# Altium schematic symbol library IC_ADI.SCHLIB: 3169 symbols (part 50 of 181)
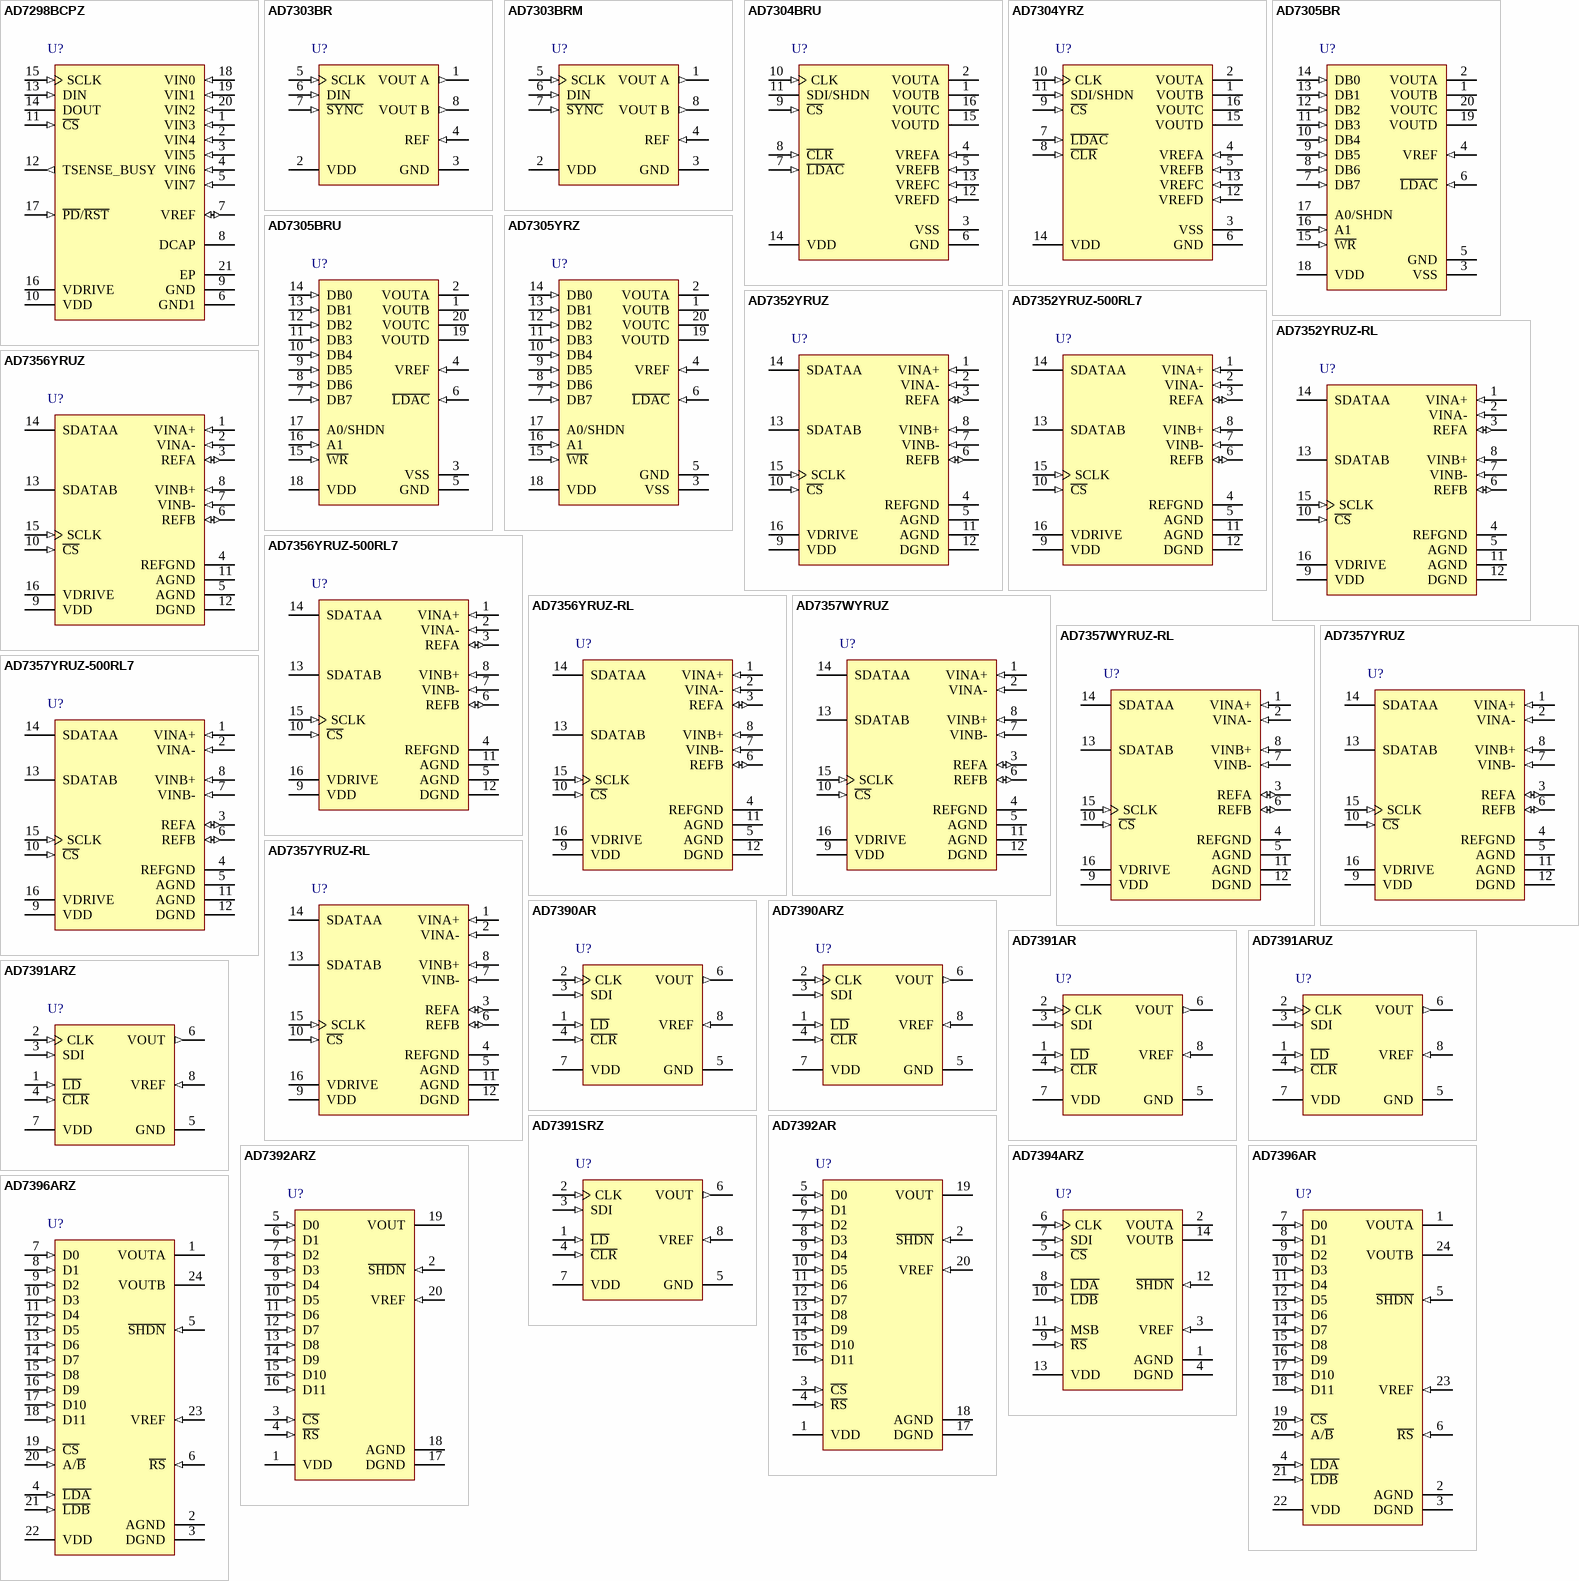
[diagram p240: symbols AD7298BCPZ to AD7396ARZ]

## AD7357YRUZ-500RL7
designator U?
Dual 14-Bit SAR Analog-to-Digital Converter with Serial, SPI Interface, Simultaneous Sampling, 4.25MSPS, -40 to +125 degC, RU-16, Pb-Free, Reel; Generic Part Number: AD7357; PartNumber: AD7357YRUZ-500RL7; Resolution (Bits): 14; Channels: 2; Throughput Rate (SPS): 4.25M; Interface: Ser, SPI; Automotive Qualified: Yes; DatasheetVersion: Rev.B; PackageVersion: Nov-2002; PackageReference: RU-16; PackageDescription: 16-Lead Thin Shrink Small Outline Package [TSSOP]; Supplier Part Number 1: AD7357YRUZ-500RL7-ND; Supplier Part Number 2: 584-AD7357YRUZ-500R7; RoHS: Y; Packing: Reel; Mounting Technology: Surface Mount; Code_JEDEC: MO-153-AB; ComponentLink1Description: Manufacturer URL; ComponentLink2Description: Datasheet; ComponentLink3Description: Package Specification; ComponentLink4Description: Product URL
footprint TSSOP16_0.65 (Footprint not found)
pins: 1 VINA+ (in) "Analog Inputs of ADC A. These analog inputs form a fully differential pair.", 2 VINA- (in) "Analog Inputs of ADC A. These analog inputs form a fully differential pair.", 3 REFA (io) "Reference Decoupling Capacitor Pins. Decoupling capacitors are connected between these pins and the REFGND pin to decouple the reference buffer for each respective ADC. It is recommended to decouple each reference pin with a (See Datasheet)", 4 REFGND (power) "Reference Ground. This is the ground reference point for the reference circuitry on the AD7357. Any external reference signal should be referred to this REFGND voltage. Decoupling capacitors must be placed between this pin (See Datasheet)", 5 AGND (power) "Analog Ground. This is the ground reference point for all analog circuitry on the AD7357. All analog input signals should be referred to this AGND voltage. The AGND and DGND voltages should ideally be at the same potential (See Datasheet)", 6 REFB (io) "Reference Decoupling Capacitor Pins. Decoupling capacitors are connected between these pins and the REFGND pin to decouple the reference buffer for each respective ADC. It is recommended to decouple each reference pin with a (See Datasheet)", 7 VINB- (in) "Analog Inputs of ADC B. These analog inputs form a fully differential pair.", 8 VINB+ (in) "Analog Inputs of ADC B. These analog inputs form a fully differential pair.", 9 VDD (power) "Power Supply Input. The VDD range for the AD7357 is 2.5 V +/- 10%. The supply should be decoupled to AGND with a 0.1uF capacitor and a 10uF tantalum capacitor.", 10 ~{CS} (in) "Chip Select. Active low, logic input. This input provides the dual function of initiating conversions on the AD7357 and framing the serial data transfer.", 11 AGND (power) "Analog Ground. This is the ground reference point for all analog circuitry on the AD7357. All analog input signals should be referred to this AGND voltage. The AGND and DGND voltages should ideally be at the same potential (See Datasheet)", 12 DGND (power) "Digital Ground. This is the ground reference point for all digital circuitry on the AD7357. This pin should connect to the DGND plane of a system. The DGND and AGND voltages should ideally be at the same potential and must (See Datasheet)", 13 SDATAB (hiz) "Serial Data Outputs. The data output is supplied to each pin as a serial data stream. The bits are clocked out on the falling edge of the SCLK input. 16 SCLK falling edges are required to access the 14 bits of data from the (See Datasheet)", 14 SDATAA (hiz) "Serial Data Outputs. The data output is supplied to each pin as a serial data stream. The bits are clocked out on the falling edge of the SCLK input. 16 SCLK falling edges are required to access the 14 bits of data from the (See Datasheet)", 15 SCLK (in) "Serial Clock. Logic input. A serial clock input provides the SCLK for accessing the data from the AD7357. This clock is also used as the clock source for the conversion process.", 16 VDRIVE (power) "Logic Power Supply Input. The voltage supplied at this pin determines at what voltage the interface operates. This pin should be decoupled to DGND. The voltage at this pin may be different to that at VDD."

## AD7357YRUZ-RL
designator U?
Dual 14-Bit SAR Analog-to-Digital Converter with Serial, SPI Interface, Simultaneous Sampling, 4.25MSPS, -40 to +125 degC, RU-16, Pb-Free, Reel; Generic Part Number: AD7357; PartNumber: AD7357YRUZ-RL; Resolution (Bits): 14; Channels: 2; Throughput Rate (SPS): 4.25M; Interface: Ser, SPI; Automotive Qualified: Yes; DatasheetVersion: Rev.B; PackageVersion: Nov-2002; PackageReference: RU-16; PackageDescription: 16-Lead Thin Shrink Small Outline Package [TSSOP]; Supplier Part Number 1: AD7357YRUZ-RL-ND; Supplier Part Number 2: 584-AD7357YRUZ-R; RoHS: Y; Packing: Reel; Mounting Technology: Surface Mount; Code_JEDEC: MO-153-AB; ComponentLink1Description: Manufacturer URL; ComponentLink2Description: Datasheet; ComponentLink3Description: Package Specification; ComponentLink4Description: Product URL
footprint TSSOP16_0.65 (Footprint not found)
pins: 1 VINA+ (in) "Analog Inputs of ADC A. These analog inputs form a fully differential pair.", 2 VINA- (in) "Analog Inputs of ADC A. These analog inputs form a fully differential pair.", 3 REFA (io) "Reference Decoupling Capacitor Pins. Decoupling capacitors are connected between these pins and the REFGND pin to decouple the reference buffer for each respective ADC. It is recommended to decouple each reference pin with a (See Datasheet)", 4 REFGND (power) "Reference Ground. This is the ground reference point for the reference circuitry on the AD7357. Any external reference signal should be referred to this REFGND voltage. Decoupling capacitors must be placed between this pin (See Datasheet)", 5 AGND (power) "Analog Ground. This is the ground reference point for all analog circuitry on the AD7357. All analog input signals should be referred to this AGND voltage. The AGND and DGND voltages should ideally be at the same potential (See Datasheet)", 6 REFB (io) "Reference Decoupling Capacitor Pins. Decoupling capacitors are connected between these pins and the REFGND pin to decouple the reference buffer for each respective ADC. It is recommended to decouple each reference pin with a (See Datasheet)", 7 VINB- (in) "Analog Inputs of ADC B. These analog inputs form a fully differential pair.", 8 VINB+ (in) "Analog Inputs of ADC B. These analog inputs form a fully differential pair.", 9 VDD (power) "Power Supply Input. The VDD range for the AD7357 is 2.5 V +/- 10%. The supply should be decoupled to AGND with a 0.1uF capacitor and a 10uF tantalum capacitor.", 10 ~{CS} (in) "Chip Select. Active low, logic input. This input provides the dual function of initiating conversions on the AD7357 and framing the serial data transfer.", 11 AGND (power) "Analog Ground. This is the ground reference point for all analog circuitry on the AD7357. All analog input signals should be referred to this AGND voltage. The AGND and DGND voltages should ideally be at the same potential (See Datasheet)", 12 DGND (power) "Digital Ground. This is the ground reference point for all digital circuitry on the AD7357. This pin should connect to the DGND plane of a system. The DGND and AGND voltages should ideally be at the same potential and must (See Datasheet)", 13 SDATAB (hiz) "Serial Data Outputs. The data output is supplied to each pin as a serial data stream. The bits are clocked out on the falling edge of the SCLK input. 16 SCLK falling edges are required to access the 14 bits of data from the (See Datasheet)", 14 SDATAA (hiz) "Serial Data Outputs. The data output is supplied to each pin as a serial data stream. The bits are clocked out on the falling edge of the SCLK input. 16 SCLK falling edges are required to access the 14 bits of data from the (See Datasheet)", 15 SCLK (in) "Serial Clock. Logic input. A serial clock input provides the SCLK for accessing the data from the AD7357. This clock is also used as the clock source for the conversion process.", 16 VDRIVE (power) "Logic Power Supply Input. The voltage supplied at this pin determines at what voltage the interface operates. This pin should be decoupled to DGND. The voltage at this pin may be different to that at VDD."

## AD7390AR
designator U?
Single 12-Bit Digital-to-Analog Converter with Serial Interface, -40 to 85 degC, R-8, Tube; Generic Part Number: AD7390; PartNumber: AD7390AR; # DAC Outputs: 1; Max V+: 5.5V; Op Pwr Diss: 500礧; Resolution (Bits): 12; Settling Time: 60祍; Single Supply: Yes; DatasheetVersion: Rev.A; PackageVersion: 060506-A; PackageReference: R-8; PackageDescription: 8-Lead Standard Small Outline Package [SOIC_N] Narrow Body; Supplier Part Number 1: AD7390AR-ND; Supplier Part Number 2: 584-AD7390AR; Packing: Tube; RoHS: N; Mounting Technology: Surface Mount; Code_JEDEC: MS-012-AA; Code_IPC: SOIC127P600-8; ComponentLink1Description: Manufacturer URL; ComponentLink2Description: Datasheet; ComponentLink3Description: Package Specification; ComponentLink4Description: Product URL
footprint SOIC8_1.27 (Footprint not found)
pins: 1 ~{LD} (in) "Load Strobe. Transfers shift registerdata to DAC register while active low.See truth table for operation.", 2 CLK (in) "Clock Input. Positive edge clocks data into shift register.", 3 SDI (in) "Serial Data Input. Data loads directly into the shift register.", 4 ~{CLR} (in) "Resets DAC register to zero condition.Active low input.", 5 GND (power) "Analog and Digital Ground.", 6 VOUT (out) "DAC Voltage Output. Full-scale output 1 LSB less than reference input voltage REF.", 7 VDD (power) "Positive Power Supply Input. Specified range of operation 2.7 V to 5.5 V.", 8 VREF (in) "DAC Reference Input Pin. Establishes DAC full-scale voltage."

## AD7390ARZ
designator U?
Single 12-Bit Digital-to-Analog Converter with Serial Interface, -40 to 85 degC, R-8, Pb-Free, Tube; Generic Part Number: AD7390; PartNumber: AD7390ARZ; # DAC Outputs: 1; Max V+: 5.5V; Op Pwr Diss: 500礧; Resolution (Bits): 12; Settling Time: 60祍; Single Supply: Yes; DatasheetVersion: Rev.A; PackageVersion: 060506-A; PackageReference: R-8; PackageDescription: 8-Lead Standard Small Outline Package [SOIC_N] Narrow Body; Supplier Part Number 1: AD7390ARZ-ND; Supplier Part Number 2: 1498718; Supplier Part Number 3: 15P0796; Supplier Part Number 4: 59K4759; Supplier Part Number 5: 584-AD7390ARZ; Packing: Tube; RoHS: Y; Mounting Technology: Surface Mount; Code_JEDEC: MS-012-AA; Code_IPC: SOIC127P600-8; ComponentLink1Description: Manufacturer URL; ComponentLink2Description: Datasheet; ComponentLink3Description: Package Specification; ComponentLink4Description: Product URL
footprint SOIC8_1.27 (Footprint not found)
pins: 1 ~{LD} (in) "Load Strobe. Transfers shift registerdata to DAC register while active low.See truth table for operation.", 2 CLK (in) "Clock Input. Positive edge clocks data into shift register.", 3 SDI (in) "Serial Data Input. Data loads directly into the shift register.", 4 ~{CLR} (in) "Resets DAC register to zero condition.Active low input.", 5 GND (power) "Analog and Digital Ground.", 6 VOUT (out) "DAC Voltage Output. Full-scale output 1 LSB less than reference input voltage REF.", 7 VDD (power) "Positive Power Supply Input. Specified range of operation 2.7 V to 5.5 V.", 8 VREF (in) "DAC Reference Input Pin. Establishes DAC full-scale voltage."

## AD7391AR
designator U?
Single 10-Bit Digital-to-Analog Converter with Serial Interface, -40 to 125 degC, R-8, Tube; Generic Part Number: AD7391; PartNumber: AD7391AR; # DAC Outputs: 1; Max V+: 5.5V; Op Pwr Diss: 500礧; Resolution (Bits): 10; Settling Time: 60祍; Single Supply: Yes; DatasheetVersion: Rev.A; PackageVersion: 060506-A; PackageReference: R-8; PackageDescription: 8-Lead Standard Small Outline Package [SOIC_N] Narrow Body; Supplier Part Number 1: AD7391AR-ND; Supplier Part Number 2: 584-AD7391AR; Packing: Tube; RoHS: N; Mounting Technology: Surface Mount; Code_JEDEC: MS-012-AA; Code_IPC: SOIC127P600-8; ComponentLink1Description: Manufacturer URL; ComponentLink2Description: Datasheet; ComponentLink3Description: Package Specification; ComponentLink4Description: Product URL
footprint SOIC8_1.27 (Footprint not found)
pins: 1 ~{LD} (in) "Load Strobe. Transfers shift register data to DAC register while active low.See truth table for operation.", 2 CLK (in) "Clock Input. Positive edge clocks data into shift register.", 3 SDI (in) "Serial Data Input. Data loads directly into the shift register.", 4 ~{CLR} (in) "Resets DAC register to zero condition.Active low input.", 5 GND (power) "Analog and Digital Ground.", 6 VOUT (out) "DAC Voltage Output. Full-scale output 1 LSB less than reference input voltage REF.", 7 VDD (power) "Positive Power Supply Input. Specified range of operation 2.7 V to 5.5 V.", 8 VREF (in) "DAC Reference Input Pin. Establishes DAC full-scale voltage."

## AD7391ARUZ
designator U?
Single 10-Bit Digital-to-Analog Converter with Serial Interface, -40 to 85 degC, RU-8, Pb-Free, Tube; Generic Part Number: AD7391; PartNumber: AD7391ARUZ; # DAC Outputs: 1; Max V+: 5.5V; Op Pwr Diss: 500礧; Resolution (Bits): 10; Settling Time: 60祍; Single Supply: Yes; DatasheetVersion: Rev.A; PackageVersion: 1997; PackageReference: RU-8; PackageDescription: 8-Pin Thin Small Outline Package 0.65 mm Pitch; Supplier Part Number 1: AD7391ARUZ-ND; Supplier Part Number 2: 584-AD7391ARUZ; Packing: Tube; RoHS: Y; Mounting Technology: Surface Mount; ComponentLink1Description: Manufacturer URL; ComponentLink2Description: Datasheet; ComponentLink3Description: Package Specification; ComponentLink4Description: Product URL
footprint SSOP8_0.65 (Footprint not found)
pins: 1 ~{LD} (in) "Load Strobe. Transfers shift register data to DAC register while active low.See truth table for operation.", 2 CLK (in) "Clock Input. Positive edge clocks data into shift register.", 3 SDI (in) "Serial Data Input. Data loads directly into the shift register.", 4 ~{CLR} (in) "Resets DAC register to zero condition.Active low input.", 5 GND (power) "Analog and Digital Ground.", 6 VOUT (out) "DAC Voltage Output. Full-scale output 1 LSB less than reference input voltage REF.", 7 VDD (power) "Positive Power Supply Input. Specified range of operation 2.7 V to 5.5 V.", 8 VREF (in) "DAC Reference Input Pin. Establishes DAC full-scale voltage."

## AD7391ARZ
designator U?
Single 10-Bit Digital-to-Analog Converter with Serial Interface, -40 to 125 degC, R-8, Pb-Free, Tube; Generic Part Number: AD7391; PartNumber: AD7391ARZ; # DAC Outputs: 1; Max V+: 5.5V; Op Pwr Diss: 500礧; Resolution (Bits): 10; Settling Time: 60祍; Single Supply: Yes; DatasheetVersion: Rev.A; PackageVersion: 060506-A; PackageReference: R-8; PackageDescription: 8-Lead Standard Small Outline Package [SOIC_N] Narrow Body; Supplier Part Number 1: AD7391ARZ-ND; Supplier Part Number 2: 1498720; Supplier Part Number 3: 15P0798; Supplier Part Number 4: 59K4761; Supplier Part Number 5: 584-AD7391ARZ; Packing: Tube; RoHS: Y; Mounting Technology: Surface Mount; Code_JEDEC: MS-012-AA; Code_IPC: SOIC127P600-8; ComponentLink1Description: Manufacturer URL; ComponentLink2Description: Datasheet; ComponentLink3Description: Package Specification; ComponentLink4Description: Product URL
footprint SOIC8_1.27 (Footprint not found)
pins: 1 ~{LD} (in) "Load Strobe. Transfers shift register data to DAC register while active low.See truth table for operation.", 2 CLK (in) "Clock Input. Positive edge clocks data into shift register.", 3 SDI (in) "Serial Data Input. Data loads directly into the shift register.", 4 ~{CLR} (in) "Resets DAC register to zero condition.Active low input.", 5 GND (power) "Analog and Digital Ground.", 6 VOUT (out) "DAC Voltage Output. Full-scale output 1 LSB less than reference input voltage REF.", 7 VDD (power) "Positive Power Supply Input. Specified range of operation 2.7 V to 5.5 V.", 8 VREF (in) "DAC Reference Input Pin. Establishes DAC full-scale voltage."

## AD7391SRZ
designator U?
Single 10-Bit Digital-to-Analog Converter with Serial Interface, -55 to 125 degC, R-8, Pb-Free, Tube; Generic Part Number: AD7391; PartNumber: AD7391SRZ; # DAC Outputs: 1; Max V+: 5.5V; Op Pwr Diss: 500礧; Resolution (Bits): 10; Settling Time: 60祍; Single Supply: Yes; DatasheetVersion: Rev.A; PackageVersion: 060506-A; PackageReference: R-8; PackageDescription: 8-Lead Standard Small Outline Package [SOIC_N] Narrow Body; Supplier Part Number 1: AD7391SRZ-ND; Supplier Part Number 2: 584-AD7391SRZ; Packing: Tube; RoHS: Y; Mounting Technology: Surface Mount; Code_JEDEC: MS-012-AA; Code_IPC: SOIC127P600-8; ComponentLink1Description: Manufacturer URL; ComponentLink2Description: Datasheet; ComponentLink3Description: Package Specification; ComponentLink4Description: Product URL
footprint SOIC8_1.27 (Footprint not found)
pins: 1 ~{LD} (in) "Load Strobe. Transfers shift register data to DAC register while active low.See truth table for operation.", 2 CLK (in) "Clock Input. Positive edge clocks data into shift register.", 3 SDI (in) "Serial Data Input. Data loads directly into the shift register.", 4 ~{CLR} (in) "Resets DAC register to zero condition.Active low input.", 5 GND (power) "Analog and Digital Ground.", 6 VOUT (out) "DAC Voltage Output. Full-scale output 1 LSB less than reference input voltage REF.", 7 VDD (power) "Positive Power Supply Input. Specified range of operation 2.7 V to 5.5 V.", 8 VREF (in) "DAC Reference Input Pin. Establishes DAC full-scale voltage."

## AD7392AR
designator U?
Single 12-Bit Digital-to-Analog Converter with Parallel Interface, 3 V, -40 to +85 degC, RW-20, Tube; Generic Part Number: AD7392; PartNumber: AD7392AR; # DAC Outputs: 1; Max V+: 5.5V; Op Pwr Diss: 300礧; Resolution (Bits): 12; Settling Time: 60祍; Single Supply: Yes; DatasheetVersion: Rev.C; PackageVersion: 060706-A; PackageReference: RW-20; PackageDescription: 20-Lead Standard Small Outline Package [SOIC_W] Wide Body; Supplier Part Number 1: AD7392AR-ND; Supplier Part Number 2: 584-AD7392AR; Packing: Tube; RoHS: N; Mounting Technology: Surface Mount; Code_JEDEC: MS-013-AC; ComponentLink1Description: Manufacturer URL; ComponentLink2Description: Datasheet; ComponentLink3Description: Package Specification; ComponentLink4Description: Product URL
footprint SOIC20W_1.27 (Footprint not found)
pins: 1 VDD (power) "Positive Power Supply Input. The specified range of operation is 2.7 V to 5.5 V.", 2 ~{SHDN} (in) "Power Shutdown Active Low Input. DAC register contents are saved as long as power stays on the VDD pin. When S\H\D\N\ = 0, C\S\ strobes write new data into the DAC register.", 3 ~{CS} (in) "Chip Select Latch Enable, Active Low.", 4 ~{RS} (in) "Asynchronous Active Low Input. Resets the DAC register to 0.", 5 D0 (in) "Parallel Input Data Bit. D0 is the LSB.", 6 D1 (in) "Parallel Input Data Bit.", 7 D2 (in) "Parallel Input Data Bit.", 8 D3 (in) "Parallel Input Data Bit.", 9 D4 (in) "Parallel Input Data Bit.", 10 D5 (in) "Parallel Input Data Bit.", 11 D6 (in) "Parallel Input Data Bit.", 12 D7 (in) "Parallel Input Data Bit.", 13 D8 (in) "Parallel Input Data Bit.", 14 D9 (in) "Parallel Input Data Bit.", 15 D10 (in) "Parallel Input Data Bit.", 16 D11 (in) "Parallel Input Data Bit.D11 is the MSB.", 17 DGND (power) "Digital Ground.", 18 AGND (power) "Analog Ground.", 19 VOUT (hiz) "DAC Voltage Output.", 20 VREF (in) "DAC Reference Input. Establishes the DAC full-scale voltage."

## AD7392ARZ
designator U?
Single 12-Bit Digital-to-Analog Converter with Parallel Interface, 3 V, -40 to +85 degC, RW-20, Pb-Free, Tube; Generic Part Number: AD7392; PartNumber: AD7392ARZ; # DAC Outputs: 1; Max V+: 5.5V; Op Pwr Diss: 300礧; Resolution (Bits): 12; Settling Time: 60祍; Single Supply: Yes; DatasheetVersion: Rev.C; PackageVersion: 060706-A; PackageReference: RW-20; PackageDescription: 20-Lead Standard Small Outline Package [SOIC_W] Wide Body; Supplier Part Number 1: AD7392ARZ-ND; Supplier Part Number 2: 1438405; Supplier Part Number 3: 59K4765; Supplier Part Number 4: 584-AD7392ARZ; Packing: Tube; RoHS: Y; Mounting Technology: Surface Mount; Code_JEDEC: MS-013-AC; ComponentLink1Description: Manufacturer URL; ComponentLink2Description: Datasheet; ComponentLink3Description: Package Specification; ComponentLink4Description: Product URL
footprint SOIC20W_1.27 (Footprint not found)
pins: 1 VDD (power) "Positive Power Supply Input. The specified range of operation is 2.7 V to 5.5 V.", 2 ~{SHDN} (in) "Power Shutdown Active Low Input. DAC register contents are saved as long as power stays on the VDD pin. When S\H\D\N\ = 0, C\S\ strobes write new data into the DAC register.", 3 ~{CS} (in) "Chip Select Latch Enable, Active Low.", 4 ~{RS} (in) "Asynchronous Active Low Input. Resets the DAC register to 0.", 5 D0 (in) "Parallel Input Data Bit. D0 is the LSB.", 6 D1 (in) "Parallel Input Data Bit.", 7 D2 (in) "Parallel Input Data Bit.", 8 D3 (in) "Parallel Input Data Bit.", 9 D4 (in) "Parallel Input Data Bit.", 10 D5 (in) "Parallel Input Data Bit.", 11 D6 (in) "Parallel Input Data Bit.", 12 D7 (in) "Parallel Input Data Bit.", 13 D8 (in) "Parallel Input Data Bit.", 14 D9 (in) "Parallel Input Data Bit.", 15 D10 (in) "Parallel Input Data Bit.", 16 D11 (in) "Parallel Input Data Bit.D11 is the MSB.", 17 DGND (power) "Digital Ground.", 18 AGND (power) "Analog Ground.", 19 VOUT (hiz) "DAC Voltage Output.", 20 VREF (in) "DAC Reference Input. Establishes the DAC full-scale voltage."

## AD7394ARZ
designator U?
Dual 12-Bit Digital-to-Analog Converter with Serial Interface, 3 V / 5 V, -40 to +85 degC, R-14, Pb-Free, Tube; Generic Part Number: AD7394; PartNumber: AD7394ARZ; # DAC Outputs: 2; Max V+: 5.5V; Op Pwr Diss: 1mW; Resolution (Bits): 12; Settling Time: 60祍; Single Supply: Yes; DatasheetVersion: Rev.A; PackageVersion: 060606-A; PackageReference: R-14; PackageDescription: 14-Lead Standard Small Outline Package [SOIC_N]; Supplier Part Number 1: AD7394ARZ-ND; Supplier Part Number 2: 59K4766; Supplier Part Number 3: N/A; Packing: Tube; RoHS: Y; Mounting Technology: Surface Mount; Code_JEDEC: MS-012-AB; Code_IPC: SOIC127P600-14; ComponentLink1Description: Manufacturer URL; ComponentLink2Description: Datasheet; ComponentLink3Description: Package Specification; ComponentLink4Description: Product URL
footprint SOIC14_1.27 (Footprint not found)
pins: 1 AGND (power) "Analog Ground", 2 VOUTA (hiz) "DAC A Voltage Output.", 3 VREF (in) "DAC Reference Voltage Input Terminal. Establishes DAC full-scale output voltage. Pin can be tied to VDD pin.", 4 DGND (power) "Digital Ground. Should be tied to analog GND", 5 ~{CS} (in) "Chip Select, Active Low Input. Disables shift register loading when high. Does not affect L\D\A\ or L\D\B\ operation.", 6 CLK (in) "Clock Input. Positive edge clocks data into shift register, MSB data bit first.", 7 SDI (in) "Serial Data Input. Input data loads directly into the shift register", 8 ~{LDA} (in) "Load DAC Register Strobe. Level sensitive active low. Transfers shift register data to DAC A register. Asynchronous active low input. See Table 2 for operation", 9 ~{RS} (in) "Resets DAC register to zero condition or half-scale, depending on MSB pin logic level. Asynchronous active low input.", 10 ~{LDB} (in) "Load DAC Register Strobe. Level-sensitive active low. Transfers shift register data to DAC B register. Asynchronous active low input. See Table 2 for operation", 11 MSB (in) "Digital Input. Logic High presets DAC registers to half-scale 800H (sets MSB bit to one) when the R\S\ pin is strobed; logic low clears all DAC registers to zero (000H) when the R\S\ pin is strobed.", 12 ~{SHDN} (in) "Active Low Shutdown Control Input. Does not affect register contents as long as power is present on VDD. New data can be loaded into the shift register and DAC register during shutdown. When device is powered up the most (See Datasheet)", 13 VDD (power) "Positive Power Supply Input. Specified range of operation is 2.7 V to 5.5 V", 14 VOUTB (hiz) "DAC B Voltage Output."

## AD7396AR
designator U?
Dual 12-Bit Digital-to-Analog Converter with Parallel Interface, 3 V, -40 to +85 degC, RW-24, Tube; Generic Part Number: AD7396; PartNumber: AD7396AR; # DAC Outputs: 2; Max V+: 5.5V; Op Pwr Diss: 1mW; Resolution (Bits): 12; Settling Time: 60祍; Single Supply: Yes; DatasheetVersion: Rev.0; PackageVersion: 060706-A; PackageReference: RW-24; PackageDescription: 24-Lead Standard Small Outline Package [SOIC_W]; Supplier Part Number 1: AD7396AR-ND; Supplier Part Number 2: 584-AD7396AR; Packing: Tube; RoHS: N; Mounting Technology: Surface Mount; Code_JEDEC: MS-013-AD; ComponentLink1Description: Manufacturer URL; ComponentLink2Description: Datasheet; ComponentLink3Description: Package Specification; ComponentLink4Description: Product URL
footprint SOIC24W_1.27 (Footprint not found)
pins: 1 VOUTA (hiz) "DAC A Voltage Output.", 2 AGND (power) "Analog Ground.", 3 DGND (power) "Digital Ground.", 4 ~{LDA} (in) "Load DAC A Register Strobe. Transfers input register data to the DAC A register. Active low inputs, Level sensitive latch. May be connected together with L\D\B\ to double-buffer load both DAC register simulataneously.", 5 ~{SHDN} (in) "Power Shutdown Active Low Input. DAC register contents are saved as long as power stays on the VDD pin.", 6 ~{RS} (in) "Resets Input and DAC Register to Zero Condition. Asynchronous active low input.", 7 D0 (in) "Twelve Parallel Input Data Bit. D0 = LSB Pin 7, AD7396.", 8 D1 (in) "Twelve Parallel Input Data Bit.", 9 D2 (in) "Twelve Parallel Input Data Bit.", 10 D3 (in) "Twelve Parallel Input Data Bit.", 11 D4 (in) "Twelve Parallel Input Data Bit.", 12 D5 (in) "Twelve Parallel Input Data Bit.", 13 D6 (in) "Twelve Parallel Input Data Bit.", 14 D7 (in) "Twelve Parallel Input Data Bit.", 15 D8 (in) "Twelve Parallel Input Data Bit.", 16 D9 (in) "Twelve Parallel Input Data Bit.", 17 D10 (in) "Twelve Parallel Input Data Bit.", 18 D11 (in) "Twelve Parallel Input Data Bit. D11 = MSB Pin 18, AD7396.", 19 ~{CS} (in) "Chip Select Latch Enable, Active Low.", 20 A/~{B} (in) "DAC Input Register Address Select DACA = 1 or DACB = 0.", 21 ~{LDB} (in) "Load DAC B Register Strobe. Transfers input register data to the DAC B register. Active low inputs, Level sensitive latch. May be connected together with L\D\A\ to double-buffer load both DAC registers simultaneously.", 22 VDD (power) "Positive Power Supply Input. Specified range of operation +2.7 V to +5.5 V.", 23 VREF (in) "DAC Reference Input Pin. Establishes DAC full-scale voltage.", 24 VOUTB (hiz) "DAC B Voltage Output."

## AD7396ARZ
designator U?
Dual 12-Bit Digital-to-Analog Converter with Parallel Interface, 3 V, -40 to +85 degC, RW-24, Pb-Free, Tube; Generic Part Number: AD7396; PartNumber: AD7396ARZ; # DAC Outputs: 2; Max V+: 5.5V; Op Pwr Diss: 1mW; Resolution (Bits): 12; Settling Time: 60祍; Single Supply: Yes; DatasheetVersion: Rev.0; PackageVersion: 060706-A; PackageReference: RW-24; PackageDescription: 24-Lead Standard Small Outline Package [SOIC_W]; Supplier Part Number 1: AD7396ARZ-ND; Supplier Part Number 2: 59K4769; Supplier Part Number 3: 584-AD7396ARZ; Packing: Tube; RoHS: Y; Mounting Technology: Surface Mount; Code_JEDEC: MS-013-AD; ComponentLink1Description: Manufacturer URL; ComponentLink2Description: Datasheet; ComponentLink3Description: Package Specification; ComponentLink4Description: Product URL
footprint SOIC24W_1.27 (Footprint not found)
pins: 1 VOUTA (hiz) "DAC A Voltage Output.", 2 AGND (power) "Analog Ground.", 3 DGND (power) "Digital Ground.", 4 ~{LDA} (in) "Load DAC A Register Strobe. Transfers input register data to the DAC A register. Active low inputs, Level sensitive latch. May be connected together with L\D\B\ to double-buffer load both DAC register simulataneously.", 5 ~{SHDN} (in) "Power Shutdown Active Low Input. DAC register contents are saved as long as power stays on the VDD pin.", 6 ~{RS} (in) "Resets Input and DAC Register to Zero Condition. Asynchronous active low input.", 7 D0 (in) "Twelve Parallel Input Data Bit. D0 = LSB Pin 7, AD7396.", 8 D1 (in) "Twelve Parallel Input Data Bit.", 9 D2 (in) "Twelve Parallel Input Data Bit.", 10 D3 (in) "Twelve Parallel Input Data Bit.", 11 D4 (in) "Twelve Parallel Input Data Bit.", 12 D5 (in) "Twelve Parallel Input Data Bit.", 13 D6 (in) "Twelve Parallel Input Data Bit.", 14 D7 (in) "Twelve Parallel Input Data Bit.", 15 D8 (in) "Twelve Parallel Input Data Bit.", 16 D9 (in) "Twelve Parallel Input Data Bit.", 17 D10 (in) "Twelve Parallel Input Data Bit.", 18 D11 (in) "Twelve Parallel Input Data Bit. D11 = MSB Pin 18, AD7396.", 19 ~{CS} (in) "Chip Select Latch Enable, Active Low.", 20 A/~{B} (in) "DAC Input Register Address Select DACA = 1 or DACB = 0.", 21 ~{LDB} (in) "Load DAC B Register Strobe. Transfers input register data to the DAC B register. Active low inputs, Level sensitive latch. May be connected together with L\D\A\ to double-buffer load both DAC registers simultaneously.", 22 VDD (power) "Positive Power Supply Input. Specified range of operation +2.7 V to +5.5 V.", 23 VREF (in) "DAC Reference Input Pin. Establishes DAC full-scale voltage.", 24 VOUTB (hiz) "DAC B Voltage Output."
